# Altium schematic symbol library Regulator_Switching.SchLib: 1070 symbols (part 3 of 9) (continued)
## LNK405LG (continued)

## LNK406EG
designator *  value LNK406EG
ki_keywords: LED Driver IC with TRIAC Dimming, Single-Stage PFC and Primary-Side Constant Current Control; ki_description: LinkSwitch-PH Family, 22W Output Power, eSIP-7C; ki_fp_filters: PowerIntegrations?eSIP?7C*; Footprint: Package_SIP:PowerIntegrations_eSIP-7C; Supplier: http://www.powerint.com/sites/default/files/product-docs/linkswitch-ph_family_datasheet.pdf
footprint PowerIntegrations_eSIP-7C
pins: 1 R (in), 2 V (in), 3 FB (in), 4 BP (in), 5 S (power), 7 D (oc)

## LNK406LG
designator *  value LNK406LG
ki_keywords: LED Driver IC with TRIAC Dimming, Single-Stage PFC and Primary-Side Constant Current Control; ki_description: LinkSwitch-PH Family, 22W Output Power, eSIP-7F; ki_fp_filters: PowerIntegrations?eSIP?7F*; Footprint: Package_SIP:PowerIntegrations_eSIP-7F; Supplier: http://www.powerint.com/sites/default/files/product-docs/linkswitch-ph_family_datasheet.pdf
footprint PowerIntegrations_eSIP-7F
pins: 1 R (in), 2 V (in), 3 FB (in), 4 BP (in), 5 S (power), 7 D (oc)

## LNK407EG
designator *  value LNK407EG
ki_keywords: LED Driver IC with TRIAC Dimming, Single-Stage PFC and Primary-Side Constant Current Control; ki_description: LinkSwitch-PH Family, 25W Output Power, eSIP-7C; ki_fp_filters: PowerIntegrations?eSIP?7C*; Footprint: Package_SIP:PowerIntegrations_eSIP-7C; Supplier: http://www.powerint.com/sites/default/files/product-docs/linkswitch-ph_family_datasheet.pdf
footprint PowerIntegrations_eSIP-7C
pins: 1 R (in), 2 V (in), 3 FB (in), 4 BP (in), 5 S (power), 7 D (oc)

## LNK407LG
designator *  value LNK407LG
ki_keywords: LED Driver IC with TRIAC Dimming, Single-Stage PFC and Primary-Side Constant Current Control; ki_description: LinkSwitch-PH Family, 25W Output Power, eSIP-7F; ki_fp_filters: PowerIntegrations?eSIP?7F*; Footprint: Package_SIP:PowerIntegrations_eSIP-7F; Supplier: http://www.powerint.com/sites/default/files/product-docs/linkswitch-ph_family_datasheet.pdf
footprint PowerIntegrations_eSIP-7F
pins: 1 R (in), 2 V (in), 3 FB (in), 4 BP (in), 5 S (power), 7 D (oc)

## LNK408EG
designator *  value LNK408EG
ki_keywords: LED Driver IC with TRIAC Dimming, Single-Stage PFC and Primary-Side Constant Current Control; ki_description: LinkSwitch-PH Family, 35W Output Power, eSIP-7C; ki_fp_filters: PowerIntegrations?eSIP?7C*; Footprint: Package_SIP:PowerIntegrations_eSIP-7C; Supplier: http://www.powerint.com/sites/default/files/product-docs/linkswitch-ph_family_datasheet.pdf
footprint PowerIntegrations_eSIP-7C
pins: 1 R (in), 2 V (in), 3 FB (in), 4 BP (in), 5 S (power), 7 D (oc)

## LNK408LG
designator *  value LNK408LG
ki_keywords: LED Driver IC with TRIAC Dimming, Single-Stage PFC and Primary-Side Constant Current Control; ki_description: LinkSwitch-PH Family, 35W Output Power, eSIP-7F; ki_fp_filters: PowerIntegrations?eSIP?7F*; Footprint: Package_SIP:PowerIntegrations_eSIP-7F; Supplier: http://www.powerint.com/sites/default/files/product-docs/linkswitch-ph_family_datasheet.pdf
footprint PowerIntegrations_eSIP-7F
pins: 1 R (in), 2 V (in), 3 FB (in), 4 BP (in), 5 S (power), 7 D (oc)

## LNK409EG
designator *  value LNK409EG
ki_keywords: LED Driver IC with TRIAC Dimming, Single-Stage PFC and Primary-Side Constant Current Control; ki_description: LinkSwitch-PH Family, 50W Output Power, eSIP-7C; ki_fp_filters: PowerIntegrations?eSIP?7C*; Footprint: Package_SIP:PowerIntegrations_eSIP-7C; Supplier: http://www.powerint.com/sites/default/files/product-docs/linkswitch-ph_family_datasheet.pdf
footprint PowerIntegrations_eSIP-7C
pins: 1 R (in), 2 V (in), 3 FB (in), 4 BP (in), 5 S (power), 7 D (oc)

## LNK409LG
designator *  value LNK409LG
ki_keywords: LED Driver IC with TRIAC Dimming, Single-Stage PFC and Primary-Side Constant Current Control; ki_description: LinkSwitch-PH Family, 50W Output Power, eSIP-7F; ki_fp_filters: PowerIntegrations?eSIP?7F*; Footprint: Package_SIP:PowerIntegrations_eSIP-7F; Supplier: http://www.powerint.com/sites/default/files/product-docs/linkswitch-ph_family_datasheet.pdf
footprint PowerIntegrations_eSIP-7F
pins: 1 R (in), 2 V (in), 3 FB (in), 4 BP (in), 5 S (power), 7 D (oc)

## LNK410EG
designator *  value LNK410EG
ki_keywords: LED Driver IC with TRIAC Dimming, Single-Stage PFC and Primary-Side Constant Current Control; ki_description: LinkSwitch-PH Family, 78W Output Power, eSIP-7C; ki_fp_filters: PowerIntegrations?eSIP?7C*; Footprint: Package_SIP:PowerIntegrations_eSIP-7C; Supplier: http://www.powerint.com/sites/default/files/product-docs/linkswitch-ph_family_datasheet.pdf
footprint PowerIntegrations_eSIP-7C
pins: 1 R (in), 2 V (in), 3 FB (in), 4 BP (in), 5 S (power), 7 D (oc)

## LNK410LG
designator *  value LNK410LG
ki_keywords: LED Driver IC with TRIAC Dimming, Single-Stage PFC and Primary-Side Constant Current Control; ki_description: LinkSwitch-PH Family, 78W Output Power, eSIP-7F; ki_fp_filters: PowerIntegrations?eSIP?7F*; Footprint: Package_SIP:PowerIntegrations_eSIP-7F; Supplier: http://www.powerint.com/sites/default/files/product-docs/linkswitch-ph_family_datasheet.pdf
footprint PowerIntegrations_eSIP-7F
pins: 1 R (in), 2 V (in), 3 FB (in), 4 BP (in), 5 S (power), 7 D (oc)

## LNK413EG
designator *  value LNK413EG
ki_keywords: LED Driver IC, Single-Stage PFC and Primary-Side Constant Current Control; ki_description: LinkSwitch-PH Family, 12W Output Power, eSIP-7C; ki_fp_filters: PowerIntegrations?eSIP?7C*; Footprint: Package_SIP:PowerIntegrations_eSIP-7C; Supplier: http://www.powerint.com/sites/default/files/product-docs/linkswitch-ph_family_datasheet.pdf
footprint PowerIntegrations_eSIP-7C
pins: 1 R (in), 2 V (in), 3 FB (in), 4 BP (in), 5 S (power), 7 D (oc)

## LNK413LG
designator *  value LNK413LG
ki_keywords: LED Driver IC, Single-Stage PFC and Primary-Side Constant Current Control; ki_description: LinkSwitch-PH Family, 12W Output Power, eSIP-7F; ki_fp_filters: PowerIntegrations?eSIP?7F*; Footprint: Package_SIP:PowerIntegrations_eSIP-7F; Supplier: http://www.powerint.com/sites/default/files/product-docs/linkswitch-ph_family_datasheet.pdf
footprint PowerIntegrations_eSIP-7F
pins: 1 R (in), 2 V (in), 3 FB (in), 4 BP (in), 5 S (power), 7 D (oc)

## LNK414EG
designator *  value LNK414EG
ki_keywords: LED Driver IC, Single-Stage PFC and Primary-Side Constant Current Control; ki_description: LinkSwitch-PH Family, 15W Output Power, eSIP-7C; ki_fp_filters: PowerIntegrations?eSIP?7C*; Footprint: Package_SIP:PowerIntegrations_eSIP-7C; Supplier: http://www.powerint.com/sites/default/files/product-docs/linkswitch-ph_family_datasheet.pdf
footprint PowerIntegrations_eSIP-7C
pins: 1 R (in), 2 V (in), 3 FB (in), 4 BP (in), 5 S (power), 7 D (oc)

## LNK414LG
designator *  value LNK414LG
ki_keywords: LED Driver IC, Single-Stage PFC and Primary-Side Constant Current Control; ki_description: LinkSwitch-PH Family, 15W Output Power, eSIP-7F; ki_fp_filters: PowerIntegrations?eSIP?7F*; Footprint: Package_SIP:PowerIntegrations_eSIP-7F; Supplier: http://www.powerint.com/sites/default/files/product-docs/linkswitch-ph_family_datasheet.pdf
footprint PowerIntegrations_eSIP-7F
pins: 1 R (in), 2 V (in), 3 FB (in), 4 BP (in), 5 S (power), 7 D (oc)

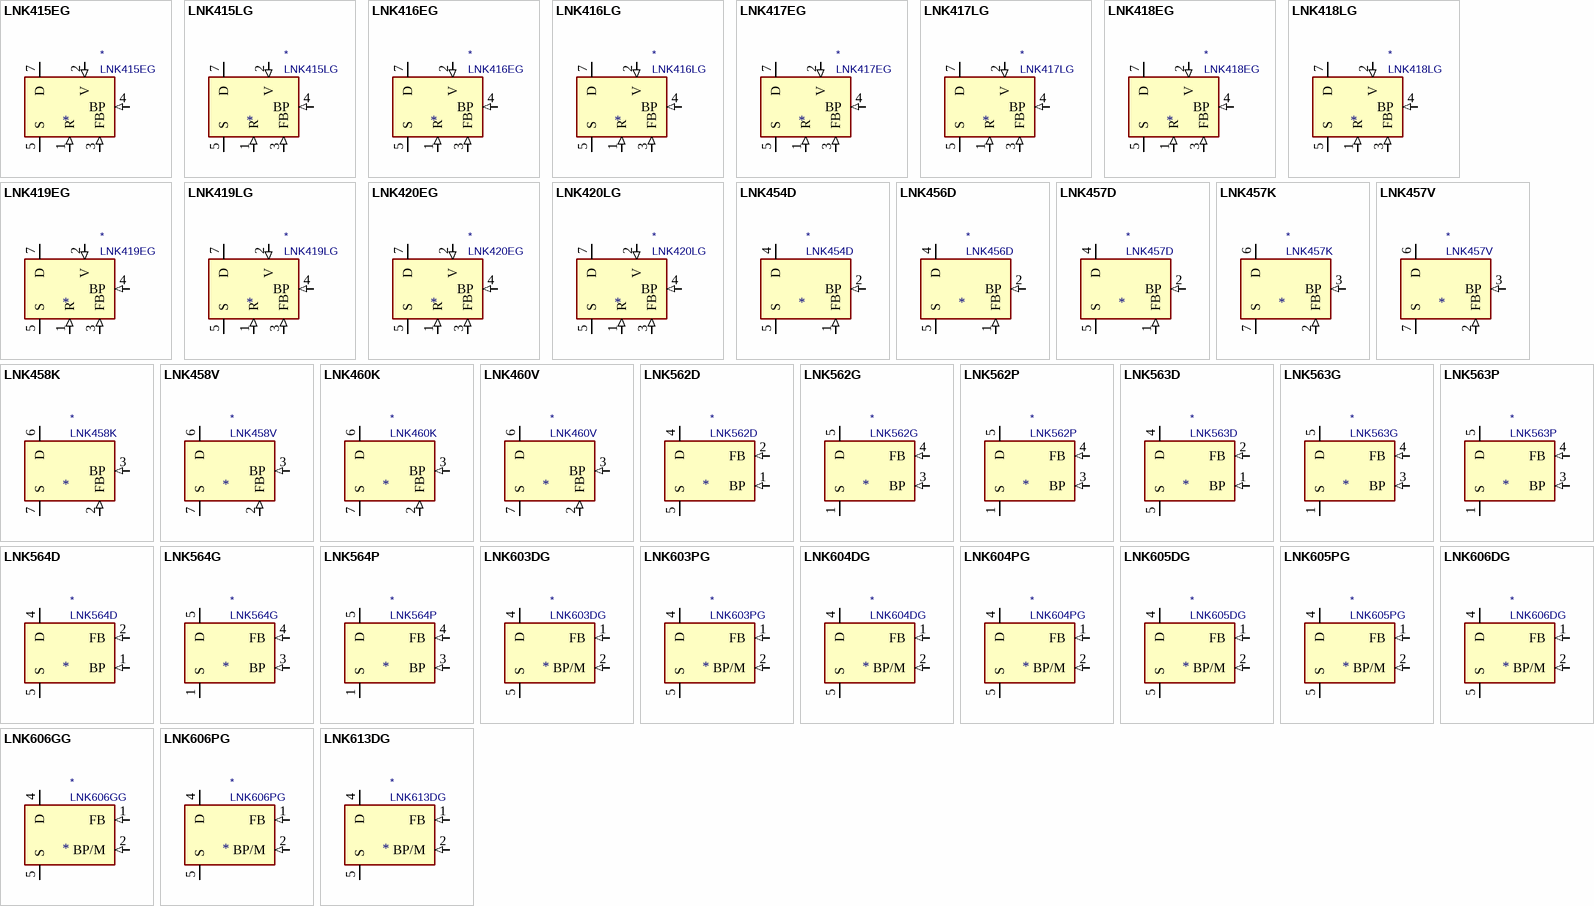
[diagram p9: symbols LNK415EG to LNK613DG]

## LNK415EG
designator *  value LNK415EG
ki_keywords: LED Driver IC, Single-Stage PFC and Primary-Side Constant Current Control; ki_description: LinkSwitch-PH Family, 18W Output Power, eSIP-7C; ki_fp_filters: PowerIntegrations?eSIP?7C*; Footprint: Package_SIP:PowerIntegrations_eSIP-7C; Supplier: http://www.powerint.com/sites/default/files/product-docs/linkswitch-ph_family_datasheet.pdf
footprint PowerIntegrations_eSIP-7C
pins: 1 R (in), 2 V (in), 3 FB (in), 4 BP (in), 5 S (power), 7 D (oc)

## LNK415LG
designator *  value LNK415LG
ki_keywords: LED Driver IC, Single-Stage PFC and Primary-Side Constant Current Control; ki_description: LinkSwitch-PH Family, 18W Output Power, eSIP-7F; ki_fp_filters: PowerIntegrations?eSIP?7F*; Footprint: Package_SIP:PowerIntegrations_eSIP-7F; Supplier: http://www.powerint.com/sites/default/files/product-docs/linkswitch-ph_family_datasheet.pdf
footprint PowerIntegrations_eSIP-7F
pins: 1 R (in), 2 V (in), 3 FB (in), 4 BP (in), 5 S (power), 7 D (oc)

## LNK416EG
designator *  value LNK416EG
ki_keywords: LED Driver IC, Single-Stage PFC and Primary-Side Constant Current Control; ki_description: LinkSwitch-PH Family, 22W Output Power, eSIP-7C; ki_fp_filters: PowerIntegrations?eSIP?7C*; Footprint: Package_SIP:PowerIntegrations_eSIP-7C; Supplier: http://www.powerint.com/sites/default/files/product-docs/linkswitch-ph_family_datasheet.pdf
footprint PowerIntegrations_eSIP-7C
pins: 1 R (in), 2 V (in), 3 FB (in), 4 BP (in), 5 S (power), 7 D (oc)

## LNK416LG
designator *  value LNK416LG
ki_keywords: LED Driver IC, Single-Stage PFC and Primary-Side Constant Current Control; ki_description: LinkSwitch-PH Family, 22W Output Power, eSIP-7F; ki_fp_filters: PowerIntegrations?eSIP?7F*; Footprint: Package_SIP:PowerIntegrations_eSIP-7F; Supplier: http://www.powerint.com/sites/default/files/product-docs/linkswitch-ph_family_datasheet.pdf
footprint PowerIntegrations_eSIP-7F
pins: 1 R (in), 2 V (in), 3 FB (in), 4 BP (in), 5 S (power), 7 D (oc)

## LNK417EG
designator *  value LNK417EG
ki_keywords: LED Driver IC, Single-Stage PFC and Primary-Side Constant Current Control; ki_description: LinkSwitch-PH Family, 25W Output Power, eSIP-7C; ki_fp_filters: PowerIntegrations?eSIP?7C*; Footprint: Package_SIP:PowerIntegrations_eSIP-7C; Supplier: http://www.powerint.com/sites/default/files/product-docs/linkswitch-ph_family_datasheet.pdf
footprint PowerIntegrations_eSIP-7C
pins: 1 R (in), 2 V (in), 3 FB (in), 4 BP (in), 5 S (power), 7 D (oc)

## LNK417LG
designator *  value LNK417LG
ki_keywords: LED Driver IC, Single-Stage PFC and Primary-Side Constant Current Control; ki_description: LinkSwitch-PH Family, 25W Output Power, eSIP-7F; ki_fp_filters: PowerIntegrations?eSIP?7F*; Footprint: Package_SIP:PowerIntegrations_eSIP-7F; Supplier: http://www.powerint.com/sites/default/files/product-docs/linkswitch-ph_family_datasheet.pdf
footprint PowerIntegrations_eSIP-7F
pins: 1 R (in), 2 V (in), 3 FB (in), 4 BP (in), 5 S (power), 7 D (oc)

## LNK418EG
designator *  value LNK418EG
ki_keywords: LED Driver IC, Single-Stage PFC and Primary-Side Constant Current Control; ki_description: LinkSwitch-PH Family, 35W Output Power, eSIP-7C; ki_fp_filters: PowerIntegrations?eSIP?7C*; Footprint: Package_SIP:PowerIntegrations_eSIP-7C; Supplier: http://www.powerint.com/sites/default/files/product-docs/linkswitch-ph_family_datasheet.pdf
footprint PowerIntegrations_eSIP-7C
pins: 1 R (in), 2 V (in), 3 FB (in), 4 BP (in), 5 S (power), 7 D (oc)

## LNK418LG
designator *  value LNK418LG
ki_keywords: LED Driver IC, Single-Stage PFC and Primary-Side Constant Current Control; ki_description: LinkSwitch-PH Family, 35W Output Power, eSIP-7F; ki_fp_filters: PowerIntegrations?eSIP?7F*; Footprint: Package_SIP:PowerIntegrations_eSIP-7F; Supplier: http://www.powerint.com/sites/default/files/product-docs/linkswitch-ph_family_datasheet.pdf
footprint PowerIntegrations_eSIP-7F
pins: 1 R (in), 2 V (in), 3 FB (in), 4 BP (in), 5 S (power), 7 D (oc)

## LNK419EG
designator *  value LNK419EG
ki_keywords: LED Driver IC, Single-Stage PFC and Primary-Side Constant Current Control; ki_description: LinkSwitch-PH Family, 50W Output Power, eSIP-7C; ki_fp_filters: PowerIntegrations?eSIP?7C*; Footprint: Package_SIP:PowerIntegrations_eSIP-7C; Supplier: http://www.powerint.com/sites/default/files/product-docs/linkswitch-ph_family_datasheet.pdf
footprint PowerIntegrations_eSIP-7C
pins: 1 R (in), 2 V (in), 3 FB (in), 4 BP (in), 5 S (power), 7 D (oc)

## LNK419LG
designator *  value LNK419LG
ki_keywords: LED Driver IC, Single-Stage PFC and Primary-Side Constant Current Control; ki_description: LinkSwitch-PH Family, 50W Output Power, eSIP-7F; ki_fp_filters: PowerIntegrations?eSIP?7F*; Footprint: Package_SIP:PowerIntegrations_eSIP-7F; Supplier: http://www.powerint.com/sites/default/files/product-docs/linkswitch-ph_family_datasheet.pdf
footprint PowerIntegrations_eSIP-7F
pins: 1 R (in), 2 V (in), 3 FB (in), 4 BP (in), 5 S (power), 7 D (oc)

## LNK420EG
designator *  value LNK420EG
ki_keywords: LED Driver IC, Single-Stage PFC and Primary-Side Constant Current Control; ki_description: LinkSwitch-PH Family, 78W Output Power, eSIP-7C; ki_fp_filters: PowerIntegrations?eSIP?7C*; Footprint: Package_SIP:PowerIntegrations_eSIP-7C; Supplier: http://www.powerint.com/sites/default/files/product-docs/linkswitch-ph_family_datasheet.pdf
footprint PowerIntegrations_eSIP-7C
pins: 1 R (in), 2 V (in), 3 FB (in), 4 BP (in), 5 S (power), 7 D (oc)

## LNK420LG
designator *  value LNK420LG
ki_keywords: LED Driver IC, Single-Stage PFC and Primary-Side Constant Current Control; ki_description: LinkSwitch-PH Family, 78W Output Power, eSIP-7F; ki_fp_filters: PowerIntegrations?eSIP?7F*; Footprint: Package_SIP:PowerIntegrations_eSIP-7F; Supplier: http://www.powerint.com/sites/default/files/product-docs/linkswitch-ph_family_datasheet.pdf
footprint PowerIntegrations_eSIP-7F
pins: 1 R (in), 2 V (in), 3 FB (in), 4 BP (in), 5 S (power), 7 D (oc)

## LNK454D
designator *  value LNK454D
ki_keywords: LED Driver IC with TRIAC Dimming, Single-Stage PFC and Constant Current Control for Non-Isolated Applications; ki_description: LinkSwitch-PL Family, 3W Output Power, SO-8C; ki_fp_filters: PowerIntegrations?SO?8C*; Footprint: Package_SO:PowerIntegrations_SO-8C; Supplier: http://www.powerint.com/sites/default/files/product-docs/linkswitch-pl_family_datasheet.pdf
footprint PowerIntegrations_SO-8C
pins: 1 FB (in), 2 BP (in), 4 D (oc), 5 S (power), 6 S hidden, 7 S hidden, 8 S hidden

## LNK456D
designator *  value LNK456D
ki_keywords: LED Driver IC with TRIAC Dimming, Single-Stage PFC and Constant Current Control for Non-Isolated Applications; ki_description: LinkSwitch-PL Family, 6W Output Power, SO-8C; ki_fp_filters: PowerIntegrations?SO?8C*; Footprint: Package_SO:PowerIntegrations_SO-8C; Supplier: http://www.powerint.com/sites/default/files/product-docs/linkswitch-pl_family_datasheet.pdf
footprint PowerIntegrations_SO-8C
pins: 1 FB (in), 2 BP (in), 4 D (oc), 5 S (power), 6 S hidden, 7 S hidden, 8 S hidden

## LNK457D
designator *  value LNK457D
ki_keywords: LED Driver IC with TRIAC Dimming, Single-Stage PFC and Constant Current Control for Non-Isolated Applications; ki_description: LinkSwitch-PL Family, 8W Output Power, SO-8C; ki_fp_filters: PowerIntegrations?SO?8C*; Footprint: Package_SO:PowerIntegrations_SO-8C; Supplier: http://www.powerint.com/sites/default/files/product-docs/linkswitch-pl_family_datasheet.pdf
footprint PowerIntegrations_SO-8C
pins: 1 FB (in), 2 BP (in), 4 D (oc), 5 S (power), 6 S hidden, 7 S hidden, 8 S hidden

## LNK457K
designator *  value LNK457K
ki_keywords: LED Driver IC with TRIAC Dimming, Single-Stage PFC and Constant Current Control for Non-Isolated Applications; ki_description: LinkSwitch-PL Family, 8W Output Power, eSOP-12B; ki_fp_filters: PowerIntegrations?eSOP?12B*; Footprint: Package_SO:PowerIntegrations_eSOP-12B; Supplier: http://www.powerint.com/sites/default/files/product-docs/linkswitch-pl_family_datasheet.pdf
footprint PowerIntegrations_eSOP-12B
pins: 1 NC (in) hidden, 2 FB (in), 3 BP (in), 4 NC (in) hidden, 6 D (oc), 7 S (power), 8 S hidden, 9 S hidden, 10 S hidden, 11 S hidden, 12 S hidden, 13 S hidden

## LNK457V
designator *  value LNK457V
ki_keywords: LED Driver IC with TRIAC Dimming, Single-Stage PFC and Constant Current Control for Non-Isolated Applications; ki_description: LinkSwitch-PL Family, 8W Output Power, eDIP-12B; ki_fp_filters: PowerIntegrations?eDIP?12B*; Footprint: Package_DIP:PowerIntegrations_eDIP-12B; Supplier: http://www.powerint.com/sites/default/files/product-docs/linkswitch-pl_family_datasheet.pdf
footprint PowerIntegrations_eDIP-12B
pins: 1 NC (in) hidden, 2 FB (in), 3 BP (in), 4 NC (in) hidden, 6 D (oc), 7 S (power), 8 S hidden, 9 S hidden, 10 S hidden, 11 S hidden, 12 S hidden

## LNK458K
designator *  value LNK458K
ki_keywords: LED Driver IC with TRIAC Dimming, Single-Stage PFC and Constant Current Control for Non-Isolated Applications; ki_description: LinkSwitch-PL Family, 11.5W Output Power, eSOP-12B; ki_fp_filters: PowerIntegrations?eSOP?12B*; Footprint: Package_SO:PowerIntegrations_eSOP-12B; Supplier: http://www.powerint.com/sites/default/files/product-docs/linkswitch-pl_family_datasheet.pdf
footprint PowerIntegrations_eSOP-12B
pins: 1 NC (in) hidden, 2 FB (in), 3 BP (in), 4 NC (in) hidden, 6 D (oc), 7 S (power), 8 S hidden, 9 S hidden, 10 S hidden, 11 S hidden, 12 S hidden, 13 S hidden

## LNK458V
designator *  value LNK458V
ki_keywords: LED Driver IC with TRIAC Dimming, Single-Stage PFC and Constant Current Control for Non-Isolated Applications; ki_description: LinkSwitch-PL Family, 8W Output Power, eDIP-12B; ki_fp_filters: PowerIntegrations?eDIP?12B*; Footprint: Package_DIP:PowerIntegrations_eDIP-12B; Supplier: http://www.powerint.com/sites/default/files/product-docs/linkswitch-pl_family_datasheet.pdf
footprint PowerIntegrations_eDIP-12B
pins: 1 NC (in) hidden, 2 FB (in), 3 BP (in), 4 NC (in) hidden, 6 D (oc), 7 S (power), 8 S hidden, 9 S hidden, 10 S hidden, 11 S hidden, 12 S hidden

## LNK460K
designator *  value LNK460K
ki_keywords: LED Driver IC with TRIAC Dimming, Single-Stage PFC and Constant Current Control for Non-Isolated Applications; ki_description: LinkSwitch-PL Family, 16W Output Power, eSOP-12B; ki_fp_filters: PowerIntegrations?eSOP?12B*; Footprint: Package_SO:PowerIntegrations_eSOP-12B; Supplier: http://www.powerint.com/sites/default/files/product-docs/linkswitch-pl_family_datasheet.pdf
footprint PowerIntegrations_eSOP-12B
pins: 1 NC (in) hidden, 2 FB (in), 3 BP (in), 4 NC (in) hidden, 6 D (oc), 7 S (power), 8 S hidden, 9 S hidden, 10 S hidden, 11 S hidden, 12 S hidden, 13 S hidden

## LNK460V
designator *  value LNK460V
ki_keywords: LED Driver IC with TRIAC Dimming, Single-Stage PFC and Constant Current Control for Non-Isolated Applications; ki_description: LinkSwitch-PL Family, 8W Output Power, eDIP-12B; ki_fp_filters: PowerIntegrations?eDIP?12B*; Footprint: Package_DIP:PowerIntegrations_eDIP-12B; Supplier: http://www.powerint.com/sites/default/files/product-docs/linkswitch-pl_family_datasheet.pdf
footprint PowerIntegrations_eDIP-12B
pins: 1 NC (in) hidden, 2 FB (in), 3 BP (in), 4 NC (in) hidden, 6 D (oc), 7 S (power), 8 S hidden, 9 S hidden, 10 S hidden, 11 S hidden, 12 S hidden

## LNK562D
designator *  value LNK562D
ki_keywords: Energy Efficient Off-Line Switcher IC for Linear Transformer Replacement; ki_description: LinkSwitch-LP Family, 1.9W Output Power, SO-8C; ki_fp_filters: PowerIntegrations?SO?8C*; Footprint: Package_SO:PowerIntegrations_SO-8C; Supplier: http://www.powerint.com/sites/default/files/product-docs/linklp_family_datasheet.pdf
footprint PowerIntegrations_SO-8C
pins: 1 BP (in), 2 FB (in), 4 D (oc), 5 S (power), 6 S hidden, 7 S hidden, 8 S hidden

## LNK562G
designator *  value LNK562G
ki_keywords: Energy Efficient Off-Line Switcher IC for Linear Transformer Replacement; ki_description: LinkSwitch-LP Family, 1.9W Output Power, SMD-8B; ki_fp_filters: PowerIntegrations?SMD?8B*; Footprint: Package_DIP:PowerIntegrations_SMD-8B; Supplier: http://www.powerint.com/sites/default/files/product-docs/linklp_family_datasheet.pdf
footprint PowerIntegrations_SMD-8B
pins: 1 S (power), 2 S hidden, 3 BP (in), 4 FB (in), 5 D (oc), 7 S hidden, 8 S hidden

## LNK562P
designator *  value LNK562P
ki_keywords: Energy Efficient Off-Line Switcher IC for Linear Transformer Replacement; ki_description: LinkSwitch-LP Family, 1.9W Output Power, DIP-8B; ki_fp_filters: PowerIntegrations?PDIP?8B*; Footprint: Package_DIP:PowerIntegrations_PDIP-8B; Supplier: http://www.powerint.com/sites/default/files/product-docs/linklp_family_datasheet.pdf
footprint PowerIntegrations_PDIP-8B
pins: 1 S (power), 2 S hidden, 3 BP (in), 4 FB (in), 5 D (oc), 7 S hidden, 8 S hidden

## LNK563D
designator *  value LNK563D
ki_keywords: Energy Efficient Off-Line Switcher IC for Linear Transformer Replacement; ki_description: LinkSwitch-LP Family, 2.5W Output Power, SO-8C; ki_fp_filters: PowerIntegrations?SO?8C*; Footprint: Package_SO:PowerIntegrations_SO-8C; Supplier: http://www.powerint.com/sites/default/files/product-docs/linklp_family_datasheet.pdf
footprint PowerIntegrations_SO-8C
pins: 1 BP (in), 2 FB (in), 4 D (oc), 5 S (power), 6 S hidden, 7 S hidden, 8 S hidden

## LNK563G
designator *  value LNK563G
ki_keywords: Energy Efficient Off-Line Switcher IC for Linear Transformer Replacement; ki_description: LinkSwitch-LP Family, 2.5W Output Power, SMD-8B; ki_fp_filters: PowerIntegrations?SMD?8B*; Footprint: Package_DIP:PowerIntegrations_SMD-8B; Supplier: http://www.powerint.com/sites/default/files/product-docs/linklp_family_datasheet.pdf
footprint PowerIntegrations_SMD-8B
pins: 1 S (power), 2 S hidden, 3 BP (in), 4 FB (in), 5 D (oc), 7 S hidden, 8 S hidden

## LNK563P
designator *  value LNK563P
ki_keywords: Energy Efficient Off-Line Switcher IC for Linear Transformer Replacement; ki_description: LinkSwitch-LP Family, 2.5W Output Power, DIP-8B; ki_fp_filters: PowerIntegrations?PDIP?8B*; Footprint: Package_DIP:PowerIntegrations_PDIP-8B; Supplier: http://www.powerint.com/sites/default/files/product-docs/linklp_family_datasheet.pdf
footprint PowerIntegrations_PDIP-8B
pins: 1 S (power), 2 S hidden, 3 BP (in), 4 FB (in), 5 D (oc), 7 S hidden, 8 S hidden

## LNK564D
designator *  value LNK564D
ki_keywords: Energy Efficient Off-Line Switcher IC for Linear Transformer Replacement; ki_description: LinkSwitch-LP Family, 3W Output Power, SO-8C; ki_fp_filters: PowerIntegrations?SO?8C*; Footprint: Package_SO:PowerIntegrations_SO-8C; Supplier: http://www.powerint.com/sites/default/files/product-docs/linklp_family_datasheet.pdf
footprint PowerIntegrations_SO-8C
pins: 1 BP (in), 2 FB (in), 4 D (oc), 5 S (power), 6 S hidden, 7 S hidden, 8 S hidden

## LNK564G
designator *  value LNK564G
ki_keywords: Energy Efficient Off-Line Switcher IC for Linear Transformer Replacement; ki_description: LinkSwitch-LP Family, 3W Output Power, SMD-8B; ki_fp_filters: PowerIntegrations?SMD?8B*; Footprint: Package_DIP:PowerIntegrations_SMD-8B; Supplier: http://www.powerint.com/sites/default/files/product-docs/linklp_family_datasheet.pdf
footprint PowerIntegrations_SMD-8B
pins: 1 S (power), 2 S hidden, 3 BP (in), 4 FB (in), 5 D (oc), 7 S hidden, 8 S hidden

## LNK564P
designator *  value LNK564P
ki_keywords: Energy Efficient Off-Line Switcher IC for Linear Transformer Replacement; ki_description: LinkSwitch-LP Family, 3W Output Power, DIP-8B; ki_fp_filters: PowerIntegrations?PDIP?8B*; Footprint: Package_DIP:PowerIntegrations_PDIP-8B; Supplier: http://www.powerint.com/sites/default/files/product-docs/linklp_family_datasheet.pdf
footprint PowerIntegrations_PDIP-8B
pins: 1 S (power), 2 S hidden, 3 BP (in), 4 FB (in), 5 D (oc), 7 S hidden, 8 S hidden

## LNK603DG
designator *  value LNK603DG
ki_keywords: Energy-Efficient, Accurate CV/CC Switcher for Adapters and Chargers; ki_description: LinkSwitch-II Family, 3.3W Output Power, SO-8C; ki_fp_filters: PowerIntegrations?SO?8C*; Footprint: Package_SO:PowerIntegrations_SO-8C; Supplier: http://www.powerint.com/sites/default/files/product-docs/linkswitch-ii_family_datasheet.pdf
footprint PowerIntegrations_SO-8C
pins: 1 FB (in), 2 BP/M (in), 4 D (oc), 5 S (power), 6 S hidden, 7 S hidden, 8 S hidden

## LNK603PG
designator *  value LNK603PG
ki_keywords: Energy-Efficient, Accurate CV/CC Switcher for Adapters and Chargers; ki_description: LinkSwitch-II Family, 3.3W Output Power, DIP-8C; ki_fp_filters: PowerIntegrations?PDIP?8C*; Footprint: Package_DIP:PowerIntegrations_PDIP-8C; Supplier: http://www.powerint.com/sites/default/files/product-docs/linkswitch-ii_family_datasheet.pdf
footprint PowerIntegrations_PDIP-8C
pins: 1 FB (in), 2 BP/M (in), 4 D (oc), 5 S (power), 6 S hidden, 7 S hidden, 8 S hidden

## LNK604DG
designator *  value LNK604DG
ki_keywords: Energy-Efficient, Accurate CV/CC Switcher for Adapters and Chargers; ki_description: LinkSwitch-II Family, 4.1W Output Power, SO-8C; ki_fp_filters: PowerIntegrations?SO?8C*; Footprint: Package_SO:PowerIntegrations_SO-8C; Supplier: http://www.powerint.com/sites/default/files/product-docs/linkswitch-ii_family_datasheet.pdf
footprint PowerIntegrations_SO-8C
pins: 1 FB (in), 2 BP/M (in), 4 D (oc), 5 S (power), 6 S hidden, 7 S hidden, 8 S hidden

## LNK604PG
designator *  value LNK604PG
ki_keywords: Energy-Efficient, Accurate CV/CC Switcher for Adapters and Chargers; ki_description: LinkSwitch-II Family, 4.1W Output Power, DIP-8C; ki_fp_filters: PowerIntegrations?PDIP?8C*; Footprint: Package_DIP:PowerIntegrations_PDIP-8C; Supplier: http://www.powerint.com/sites/default/files/product-docs/linkswitch-ii_family_datasheet.pdf
footprint PowerIntegrations_PDIP-8C
pins: 1 FB (in), 2 BP/M (in), 4 D (oc), 5 S (power), 6 S hidden, 7 S hidden, 8 S hidden

## LNK605DG
designator *  value LNK605DG
ki_keywords: Energy-Efficient, Accurate CV/CC Switcher for Adapters and Chargers; ki_description: LinkSwitch-II Family, 5.1W Output Power, SO-8C; ki_fp_filters: PowerIntegrations?SO?8C*; Footprint: Package_SO:PowerIntegrations_SO-8C; Supplier: http://www.powerint.com/sites/default/files/product-docs/linkswitch-ii_family_datasheet.pdf
footprint PowerIntegrations_SO-8C
pins: 1 FB (in), 2 BP/M (in), 4 D (oc), 5 S (power), 6 S hidden, 7 S hidden, 8 S hidden

## LNK605PG
designator *  value LNK605PG
ki_keywords: Energy-Efficient, Accurate CV/CC Switcher for Adapters and Chargers; ki_description: LinkSwitch-II Family, 5.1W Output Power, DIP-8C; ki_fp_filters: PowerIntegrations?PDIP?8C*; Footprint: Package_DIP:PowerIntegrations_PDIP-8C; Supplier: http://www.powerint.com/sites/default/files/product-docs/linkswitch-ii_family_datasheet.pdf
footprint PowerIntegrations_PDIP-8C
pins: 1 FB (in), 2 BP/M (in), 4 D (oc), 5 S (power), 6 S hidden, 7 S hidden, 8 S hidden

## LNK606DG
designator *  value LNK606DG
ki_keywords: Energy-Efficient, Accurate CV/CC Switcher for Adapters and Chargers; ki_description: LinkSwitch-II Family, 6.1W Output Power, SO-8C; ki_fp_filters: PowerIntegrations?SO?8C*; Footprint: Package_SO:PowerIntegrations_SO-8C; Supplier: http://www.powerint.com/sites/default/files/product-docs/linkswitch-ii_family_datasheet.pdf
footprint PowerIntegrations_SO-8C
pins: 1 FB (in), 2 BP/M (in), 4 D (oc), 5 S (power), 6 S hidden, 7 S hidden, 8 S hidden

## LNK606GG
designator *  value LNK606GG
ki_keywords: Energy-Efficient, Accurate CV/CC Switcher for Adapters and Chargers; ki_description: LinkSwitch-II Family, 6.1W Output Power, SMD-8C; ki_fp_filters: PowerIntegrations?SMD?8C*; Footprint: Package_DIP:PowerIntegrations_SMD-8C; Supplier: http://www.powerint.com/sites/default/files/product-docs/linkswitch-ii_family_datasheet.pdf
footprint PowerIntegrations_SMD-8C
pins: 1 FB (in), 2 BP/M (in), 4 D (oc), 5 S (power), 6 S hidden, 7 S hidden, 8 S hidden

## LNK606PG
designator *  value LNK606PG
ki_keywords: Energy-Efficient, Accurate CV/CC Switcher for Adapters and Chargers; ki_description: LinkSwitch-II Family, 6.1W Output Power, DIP-8C; ki_fp_filters: PowerIntegrations?PDIP?8C*; Footprint: Package_DIP:PowerIntegrations_PDIP-8C; Supplier: http://www.powerint.com/sites/default/files/product-docs/linkswitch-ii_family_datasheet.pdf
footprint PowerIntegrations_PDIP-8C
pins: 1 FB (in), 2 BP/M (in), 4 D (oc), 5 S (power), 6 S hidden, 7 S hidden, 8 S hidden

## LNK613DG
designator *  value LNK613DG
ki_keywords: Energy-Efficient, Accurate CV/CC Switcher for Adapters and Chargers; ki_description: LinkSwitch-II Family, 3.3W Output Power, SO-8C; ki_fp_filters: PowerIntegrations?SO?8C*; Footprint: Package_SO:PowerIntegrations_SO-8C; Supplier: http://www.powerint.com/sites/default/files/product-docs/linkswitch-ii_family_datasheet.pdf
footprint PowerIntegrations_SO-8C
pins: 1 FB (in), 2 BP/M (in), 4 D (oc), 5 S (power), 6 S hidden, 7 S hidden, 8 S hidden

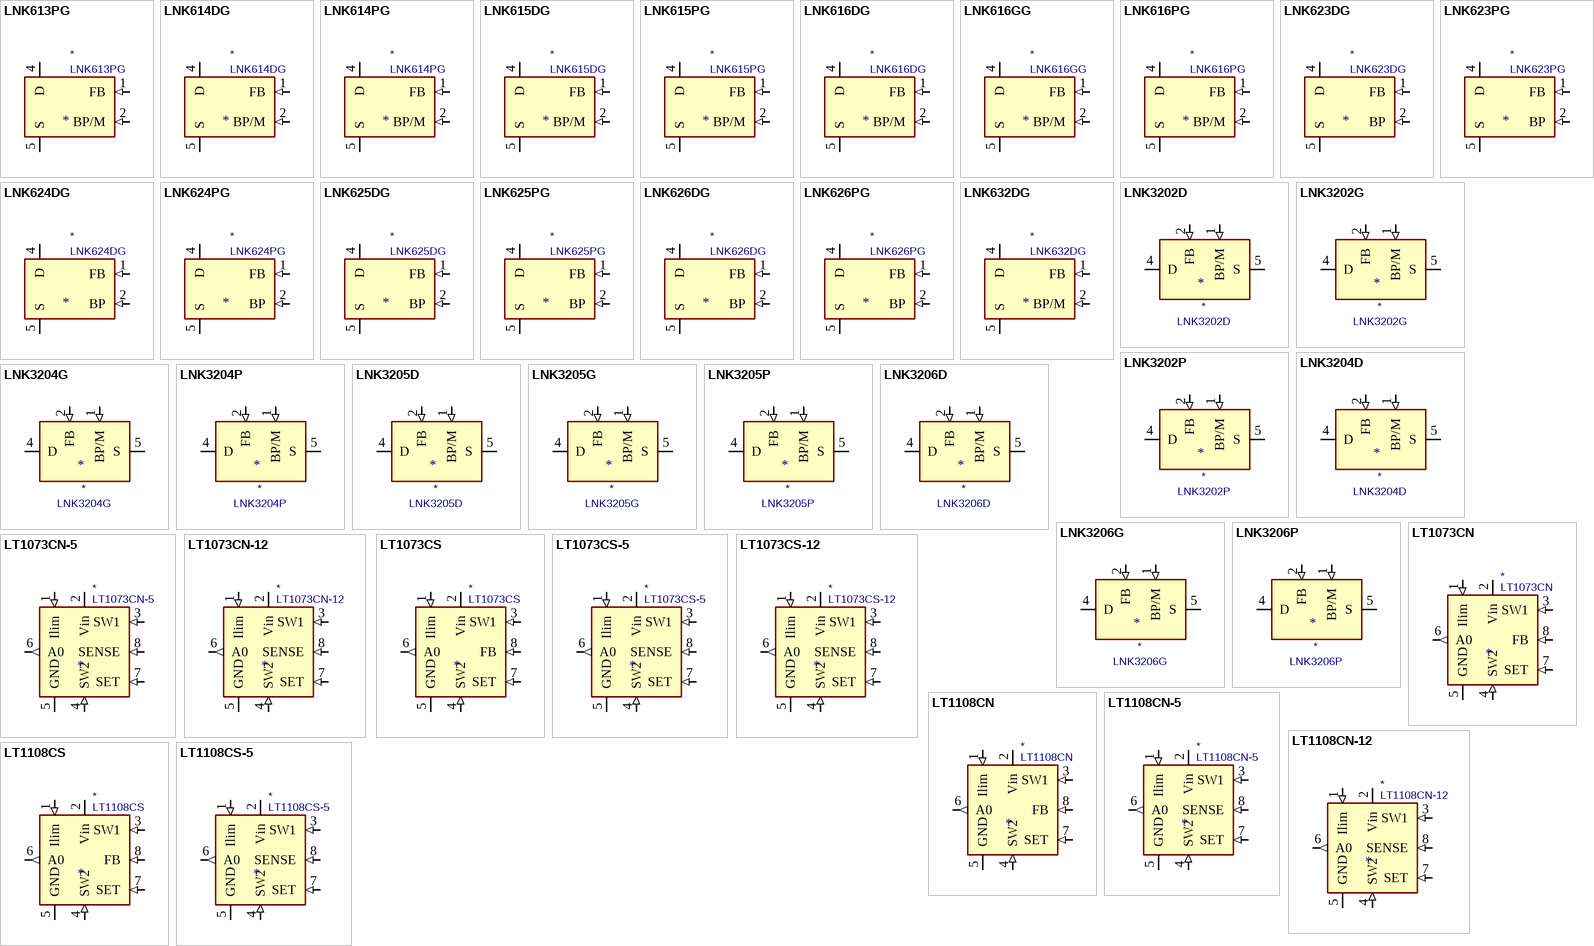
[diagram p10: symbols LNK613PG to LT1108CS-5]

## LNK613PG
designator *  value LNK613PG
ki_keywords: Energy-Efficient, Accurate CV/CC Switcher for Adapters and Chargers; ki_description: LinkSwitch-II Family, 3.3W Output Power, DIP-8C; ki_fp_filters: PowerIntegrations?PDIP?8C*; Footprint: Package_DIP:PowerIntegrations_PDIP-8C; Supplier: http://www.powerint.com/sites/default/files/product-docs/linkswitch-ii_family_datasheet.pdf
footprint PowerIntegrations_PDIP-8C
pins: 1 FB (in), 2 BP/M (in), 4 D (oc), 5 S (power), 6 S hidden, 7 S hidden, 8 S hidden

## LNK614DG
designator *  value LNK614DG
ki_keywords: Energy-Efficient, Accurate CV/CC Switcher for Adapters and Chargers; ki_description: LinkSwitch-II Family, 4.1W Output Power, SO-8C; ki_fp_filters: PowerIntegrations?SO?8C*; Footprint: Package_SO:PowerIntegrations_SO-8C; Supplier: http://www.powerint.com/sites/default/files/product-docs/linkswitch-ii_family_datasheet.pdf
footprint PowerIntegrations_SO-8C
pins: 1 FB (in), 2 BP/M (in), 4 D (oc), 5 S (power), 6 S hidden, 7 S hidden, 8 S hidden

## LNK614PG
designator *  value LNK614PG
ki_keywords: Energy-Efficient, Accurate CV/CC Switcher for Adapters and Chargers; ki_description: LinkSwitch-II Family, 4.1W Output Power, DIP-8C; ki_fp_filters: PowerIntegrations?PDIP?8C*; Footprint: Package_DIP:PowerIntegrations_PDIP-8C; Supplier: http://www.powerint.com/sites/default/files/product-docs/linkswitch-ii_family_datasheet.pdf
footprint PowerIntegrations_PDIP-8C
pins: 1 FB (in), 2 BP/M (in), 4 D (oc), 5 S (power), 6 S hidden, 7 S hidden, 8 S hidden

## LNK615DG
designator *  value LNK615DG
ki_keywords: Energy-Efficient, Accurate CV/CC Switcher for Adapters and Chargers; ki_description: LinkSwitch-II Family, 5.1W Output Power, SO-8C; ki_fp_filters: PowerIntegrations?SO?8C*; Footprint: Package_SO:PowerIntegrations_SO-8C; Supplier: http://www.powerint.com/sites/default/files/product-docs/linkswitch-ii_family_datasheet.pdf
footprint PowerIntegrations_SO-8C
pins: 1 FB (in), 2 BP/M (in), 4 D (oc), 5 S (power), 6 S hidden, 7 S hidden, 8 S hidden

## LNK615PG
designator *  value LNK615PG
ki_keywords: Energy-Efficient, Accurate CV/CC Switcher for Adapters and Chargers; ki_description: LinkSwitch-II Family, 5.1W Output Power, DIP-8C; ki_fp_filters: PowerIntegrations?PDIP?8C*; Footprint: Package_DIP:PowerIntegrations_PDIP-8C; Supplier: http://www.powerint.com/sites/default/files/product-docs/linkswitch-ii_family_datasheet.pdf
footprint PowerIntegrations_PDIP-8C
pins: 1 FB (in), 2 BP/M (in), 4 D (oc), 5 S (power), 6 S hidden, 7 S hidden, 8 S hidden

## LNK616DG
designator *  value LNK616DG
ki_keywords: Energy-Efficient, Accurate CV/CC Switcher for Adapters and Chargers; ki_description: LinkSwitch-II Family, 6.1W Output Power, SO-8C; ki_fp_filters: PowerIntegrations?SO?8C*; Footprint: Package_SO:PowerIntegrations_SO-8C; Supplier: http://www.powerint.com/sites/default/files/product-docs/linkswitch-ii_family_datasheet.pdf
footprint PowerIntegrations_SO-8C
pins: 1 FB (in), 2 BP/M (in), 4 D (oc), 5 S (power), 6 S hidden, 7 S hidden, 8 S hidden

## LNK616GG
designator *  value LNK616GG
ki_keywords: Energy-Efficient, Accurate CV/CC Switcher for Adapters and Chargers; ki_description: LinkSwitch-II Family, 6.1W Output Power, SMD-8C; ki_fp_filters: PowerIntegrations?SMD?8C*; Footprint: Package_DIP:PowerIntegrations_SMD-8C; Supplier: http://www.powerint.com/sites/default/files/product-docs/linkswitch-ii_family_datasheet.pdf
footprint PowerIntegrations_SMD-8C
pins: 1 FB (in), 2 BP/M (in), 4 D (oc), 5 S (power), 6 S hidden, 7 S hidden, 8 S hidden

## LNK616PG
designator *  value LNK616PG
ki_keywords: Energy-Efficient, Accurate CV/CC Switcher for Adapters and Chargers; ki_description: LinkSwitch-II Family, 6.1W Output Power, DIP-8C; ki_fp_filters: PowerIntegrations?PDIP?8C*; Footprint: Package_DIP:PowerIntegrations_PDIP-8C; Supplier: http://www.powerint.com/sites/default/files/product-docs/linkswitch-ii_family_datasheet.pdf
footprint PowerIntegrations_PDIP-8C
pins: 1 FB (in), 2 BP/M (in), 4 D (oc), 5 S (power), 6 S hidden, 7 S hidden, 8 S hidden

## LNK623DG
designator *  value LNK623DG
ki_keywords: Energy-Efficient, Off-line Switcher with Accurate Primary-side Constant-Voltage Control; ki_description: LinkSwitch-CV Family, 6W Output Power, SO-8C; ki_fp_filters: PowerIntegrations?SO?8C*; Footprint: Package_SO:PowerIntegrations_SO-8C; Supplier: http://www.powerint.com/sites/default/files/product-docs/linkcv_family_datasheet.pdf
footprint PowerIntegrations_SO-8C
pins: 1 FB (in), 2 BP (in), 4 D (oc), 5 S (power), 6 S hidden, 7 S hidden, 8 S hidden

## LNK623PG
designator *  value LNK623PG
ki_keywords: Energy-Efficient, Off-line Switcher with Accurate Primary-side Constant-Voltage Control; ki_description: LinkSwitch-CV Family, 6W Output Power, DIP-8C; ki_fp_filters: PowerIntegrations?PDIP?8C*; Footprint: Package_DIP:PowerIntegrations_PDIP-8C; Supplier: http://www.powerint.com/sites/default/files/product-docs/linkcv_family_datasheet.pdf
footprint PowerIntegrations_PDIP-8C
pins: 1 FB (in), 2 BP (in), 4 D (oc), 5 S (power), 6 S hidden, 7 S hidden, 8 S hidden

## LNK624DG
designator *  value LNK624DG
ki_keywords: Energy-Effi cient, Off-line Switcher with Accurate Primary-side Constant-Voltage Control; ki_description: LinkSwitch-CV Family, 6.5W Output Power, SO-8C; ki_fp_filters: PowerIntegrations?SO?8C*; Footprint: Package_SO:PowerIntegrations_SO-8C; Supplier: http://www.powerint.com/sites/default/files/product-docs/linkcv_family_datasheet.pdf
footprint PowerIntegrations_SO-8C
pins: 1 FB (in), 2 BP (in), 4 D (oc), 5 S (power), 6 S hidden, 7 S hidden, 8 S hidden

## LNK624PG
designator *  value LNK624PG
ki_keywords: Energy-Efficient, Off-line Switcher with Accurate Primary-side Constant-Voltage Control; ki_description: LinkSwitch-CV Family, 6.5W Output Power, DIP-8C; ki_fp_filters: PowerIntegrations?PDIP?8C*; Footprint: Package_DIP:PowerIntegrations_PDIP-8C; Supplier: http://www.powerint.com/sites/default/files/product-docs/linkcv_family_datasheet.pdf
footprint PowerIntegrations_PDIP-8C
pins: 1 FB (in), 2 BP (in), 4 D (oc), 5 S (power), 6 S hidden, 7 S hidden, 8 S hidden

## LNK625DG
designator *  value LNK625DG
ki_keywords: Energy-Efficient, Off-line Switcher with Accurate Primary-side Constant-Voltage Control; ki_description: LinkSwitch-CV Family, 8W Output Power, SO-8C; ki_fp_filters: PowerIntegrations?SO?8C*; Footprint: Package_SO:PowerIntegrations_SO-8C; Supplier: http://www.powerint.com/sites/default/files/product-docs/linkcv_family_datasheet.pdf
footprint PowerIntegrations_SO-8C
pins: 1 FB (in), 2 BP (in), 4 D (oc), 5 S (power), 6 S hidden, 7 S hidden, 8 S hidden

## LNK625PG
designator *  value LNK625PG
ki_keywords: Energy-Efficient, Off-line Switcher with Accurate Primary-side Constant-Voltage Control; ki_description: LinkSwitch-CV Family, 8W Output Power, DIP-8C; ki_fp_filters: PowerIntegrations?PDIP?8C*; Footprint: Package_DIP:PowerIntegrations_PDIP-8C; Supplier: http://www.powerint.com/sites/default/files/product-docs/linkcv_family_datasheet.pdf
footprint PowerIntegrations_PDIP-8C
pins: 1 FB (in), 2 BP (in), 4 D (oc), 5 S (power), 6 S hidden, 7 S hidden, 8 S hidden

## LNK626DG
designator *  value LNK626DG
ki_keywords: Energy-Efficient, Off-line Switcher with Accurate Primary-side Constant-Voltage Control; ki_description: LinkSwitch-CV Family, 10W Output Power, SO-8C; ki_fp_filters: PowerIntegrations?SO?8C*; Footprint: Package_SO:PowerIntegrations_SO-8C; Supplier: http://www.powerint.com/sites/default/files/product-docs/linkcv_family_datasheet.pdf
footprint PowerIntegrations_SO-8C
pins: 1 FB (in), 2 BP (in), 4 D (oc), 5 S (power), 6 S hidden, 7 S hidden, 8 S hidden